# Altium footprint library UP-ROBOT Devices(2013-02-26).PcbLib: 150 footprints (part 9 of 10)
Each footprint in its own frame and in the unit in brackets; x right, y up, seen from the top. Pads: shape width x height; smd on the part's side, far side on the other; paste and mask are expansions set on the pad; w line width, h text height; cw(c..) or ccw(c..) is an arc to the next point about the centre after c.
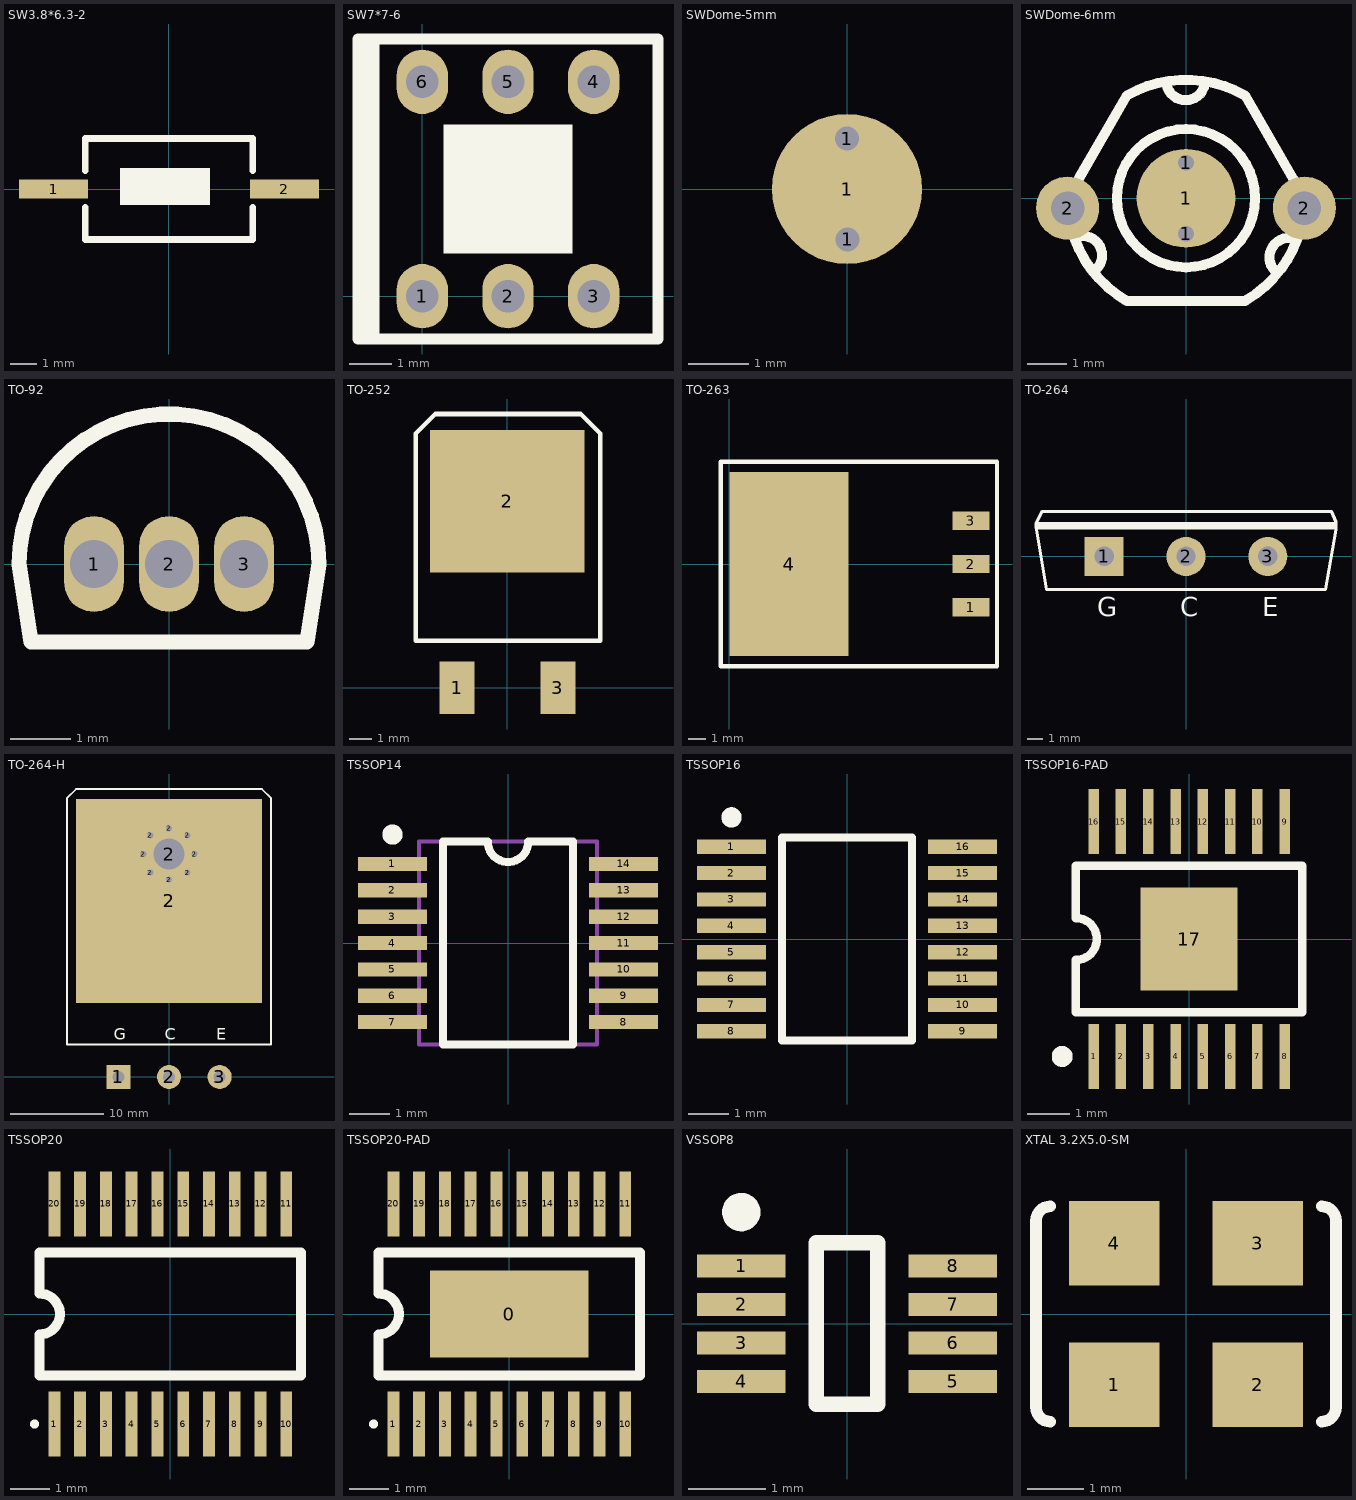
[diagram p8: the footprints below, top view; thin cyan lines are the x and y axes]

## SW3.8*6.3-2 [mm]
height 2.56
pads (2):
  rect 2.6x0.7 smd: 1(-4.35,0) 2(4.35,0)
Top Overlay:
  rectangle: -1.85,-0.6 1.55,0.8
  lines w0.254: -3.15,-0.7 -3.15,-1.9 3.15,-1.9 3.15,-0.7 ; -3.15,0.7 -3.15,1.9 3.15,1.9 3.15,0.7

## SW7*7-6 [mm]
pads (6):
  oval 1.2x1.5 hole 0.76: 1(0,0) 2(2,0) 3(4,0) 4(4,5) 5(2,5) 6(0,5)
Top Overlay:
  rectangle: 0.5,1 3.5,4
  rectangle: -1.5,-1 -1,6
  lines w0.254: -1.5,-1 5.5,-1 5.5,6 -1.5,6 -1.5,-1

## SWDome-5mm [mm]
pads (3):
  round 2.5 smd: 1(0,0)
  round 0.8 hole 0.4: 1(0,0.84) 1(0.01,-0.84)
Top Solder:
  circle w1: c0,0 r2.5
3D body: height 0.66, standoff 0, extent -3.1,-3.1 3.1,3.1

## SWDome-6mm [mm]
pads (5):
  round 0.7 hole 0.4: 1(0,-0.9) 1(0,0.9)
  round 2.5 smd: 1(0,0)
  round 1.6 hole 0.85: 2(-3,-0.25) 2(3,-0.25)
Top Overlay:
  circle w0.254: c0,0 r1.75
  lines w0.254: -2.821,-1.026 ccw(c0,0) -1.511,-2.594 ; -2.816,-1 cw(c-2.617,-1.45) -2.352,-1.864 ; -2.709,0.505 -1.5,2.6 cw(c0,0) 1.495,2.603 ; -1.5,-2.6 1.5,-2.6 ; -0.499,2.95 ccw(c-0.008,2.975) 0.484,2.95 ; 1.5,2.6 2.719,0.486 ; 1.519,-2.589 ccw(c0,0) 2.821,-1.026 ; 2.316,-1.897 cw(c2.608,-1.5) 2.801,-1.047

## TO-92 [mm]
pads (3):
  oval 1x1.6 hole 0.8: 1(-1.25,0) 2(0,0) 3(1.25,0)
Top Overlay:
  lines w0.254: -2.5,0 cw(c0,0) 2.5,0 2.3,-1.3 -2.3,-1.3 -2.5,0
3D body: height 4, standoff -3, extent -2.3,-1.2 2.28,2.34

## TO-252 [mm] "DPAK"
pads (3):
  rect 1.524x2.28 smd: 1(-2.2,0) 3(2.2,0)
  rect 6.74x6.23 smd: 2(0,8.14)
Top Overlay:
  lines w0.203: -4,2.05 -4,11.1 -3.15,11.95 3.2,11.95 4.05,11.1 4.05,2.05 -4,2.05
3D body: height 2.2, standoff 0, extent -3.24,-0.5 3.26,10.5

## TO-263 [mm]
pads (4):
  rect 2.16x1.07 smd: 1(14.17,-2.54) 2(14.17,0) 3(14.17,2.54)
  rect 7x10.8 smd: 4(3.5,0)
Top Overlay:
  lines w0.254: -0.5,-6 15.7,-6 15.7,6 -0.5,6 -0.5,-6

## TO-264 [mm]
pads (3):
  rect 2.6x2.6 hole 1.3: 1(-5.45,0)
  round 2.6 hole 1.3: 2(0,0) 3(5.45,0)
Top Overlay:
  rectangle: -10,1.8 10,2.3
  lines w0.203: -10,1.9 -10,2.2 -9.6,3 9.7,3 10,2.3 10,1.8 9.3,-2.2 -9.3,-2.2 -10,2
  text "G" at -5.9,-4 h1.27
  text "C" at -0.4,-4 h1.27
  text "E" at 5.1,-4 h1.27

## TO-264-H [mm]
pads (13):
  rect 2.6x2.6 hole 1.3: 1(-5.45,0)
  round 1.016 hole 0.66: 2(-2.75,24) 2(-2,22) 2(-2,26) 2(0,21.25) 2(0,26.75) 2(2,22) 2(2,26) 2(2.75,24)
  round 2.6 hole 1.3: 2(0,0) 3(5.45,0)
  rect 20x22 smd: 2(0,18.95)
  round 7 hole 3.3: 2(0,24)
Top Overlay:
  lines w0.2: -11,3.5 -11,30 -10,31 10,31 11,30 11,3.5 -11,3.5
  text "E" at 5.1,4 h1.27
  text "C" at -0.45,4 h1.27
  text "G" at -5.95,4 h1.27
3D body: height 5, standoff -3, extent -10,-0.279 10,30.021

## TSSOP14 [mm] "TSOP, 14-Leads, Body 5.0x4.4mm (max), Pitch 0.65mm, IPC Medium Density"
height 1.1
pads (14):
  rect 1.7x0.35 smd: 1(-2.85,1.95) 2(-2.85,1.3) 3(-2.85,0.65) 4(-2.85,0) 5(-2.85,-0.65) 6(-2.85,-1.3) 7(-2.85,-1.95) 8(2.85,-1.95) 9(2.85,-1.3) 10(2.85,-0.65) 11(2.85,0) 12(2.85,0.65) 13(2.85,1.3) 14(2.85,1.95)
Top Overlay:
  circle w0.25: c-2.85,2.675 r0.125
  lines w0.2: -1.6,-2.5 1.6,-2.5 1.6,2.5 0.5,2.5 cw(c0,2.498) -0.5,2.5 -1.6,2.5 -1.6,-2.5
Mechanical 13:
  lines w0.1: -2.2,-2.5 2.2,-2.5 2.2,2.5 -2.2,2.5 -2.2,-2.5
3D body: height 1.1, standoff 0.2, extent -2.2,-2.5 2.2,2.5

## TSSOP16 [mm]
height 1.2
pads (16):
  rect 1.7x0.35 smd: 1(-2.85,2.275) 2(-2.85,1.625) 3(-2.85,0.975) 4(-2.85,0.325) 5(-2.85,-0.325) 6(-2.85,-0.975) 7(-2.85,-1.625) 8(-2.85,-2.275) 9(2.85,-2.275) 10(2.85,-1.625) 11(2.85,-0.975) 12(2.85,-0.325) 13(2.85,0.325) 14(2.85,0.975) 15(2.85,1.625) 16(2.85,2.275)
Top Overlay:
  circle w0.25: c-2.85,3 r0.125
  lines w0.2: -1.6,-2.5 1.6,-2.5 1.6,2.5 -1.6,2.5 -1.6,-2.5
3D body: height 1.1, standoff 0, extent -3.192,-2.499 3.208,2.501

## TSSOP16-PAD [mm]
pads (17):
  rect 0.25x1.55 smd: 1(-2.275,-2.8) 2(-1.625,-2.8) 3(-0.975,-2.8) 4(-0.325,-2.8) 5(0.325,-2.8) 6(0.975,-2.8) 7(1.625,-2.8) 8(2.275,-2.8) 9(2.275,2.8) 10(1.625,2.8) 11(0.975,2.8) 12(0.325,2.8) 13(-0.325,2.8) 14(-0.975,2.8) 15(-1.625,2.8) 16(-2.275,2.8)
  rect 2.31x2.46 smd: 17(0,0)
Top Overlay:
  circle w0.25: c-3.025,-2.8 r0.125
  lines w0.203: -2.7,-1.75 2.7,-1.75 2.7,1.75 0,1.75 -2.7,1.75 -2.7,0.5 cw(c-2.7,0) -2.7,-0.5 -2.7,-1.75
3D body: height 1.2, standoff 0, extent -2.56,-3.3 2.54,3.3

## TSSOP20 [mm]
pads (20):
  rect 0.3x1.65 smd: 1(-2.925,-2.775) 2(-2.275,-2.775) 3(-1.625,-2.775) 4(-0.975,-2.775) 5(-0.325,-2.775) 6(0.325,-2.775) 7(0.975,-2.775) 8(1.625,-2.775) 9(2.275,-2.775) 10(2.925,-2.775) 11(2.925,2.775) 12(2.275,2.775) 13(1.625,2.775) 14(0.975,2.775) 15(0.325,2.775) 16(-0.325,2.775) 17(-0.975,2.775) 18(-1.625,2.775) 19(-2.275,2.775) 20(-2.925,2.775)
Top Overlay:
  circle w0.203: c-3.425,-2.775 r0.01
  lines w0.25: -3.3,-1.55 3.3,-1.55 3.3,1.55 -3.3,1.55 -3.3,0.517 cw(c-3.3,0) -3.3,-0.517 -3.3,-1.55
3D body: height 1.08, standoff -0.02, extent -3.25,-3.225 3.25,3.175

## TSSOP20-PAD [mm]
pads (21):
  rect 4x2.2 smd: 0(0,0)
  rect 0.3x1.65 smd: 1(-2.925,-2.775) 2(-2.275,-2.775) 3(-1.625,-2.775) 4(-0.975,-2.775) 5(-0.325,-2.775) 6(0.325,-2.775) 7(0.975,-2.775) 8(1.625,-2.775) 9(2.275,-2.775) 10(2.925,-2.775) 11(2.925,2.775) 12(2.275,2.775) 13(1.625,2.775) 14(0.975,2.775) 15(0.325,2.775) 16(-0.325,2.775) 17(-0.975,2.775) 18(-1.625,2.775) 19(-2.275,2.775) 20(-2.925,2.775)
Top Overlay:
  circle w0.203: c-3.425,-2.775 r0.01
  lines w0.25: -3.3,-1.55 3.3,-1.55 3.3,1.55 -3.3,1.55 -3.3,0.517 cw(c-3.3,0) -3.3,-0.517 -3.3,-1.55
3D body: height 1.08, standoff -0.02, extent -3.25,-3.225 3.25,3.175

## VSSOP8 [mm]
pads (8):
  rect 1.15x0.3 smd: 1(-1.375,0.75) 2(-1.375,0.25) 3(-1.375,-0.25) 4(-1.375,-0.75) 5(1.375,-0.75) 6(1.375,-0.25) 7(1.375,0.25) 8(1.375,0.75)
Top Overlay:
  circle w0.25: c-1.375,1.45 r0.125
  lines w0.2: -0.4,-1.05 -0.4,1.05 0.4,1.05 0.4,-1.05 -0.4,-1.05
3D body: height 1, standoff 0, extent -1.4,-1.15 1.4,1.15

## XTAL 3.2X5.0-SM [mm]
pads (4):
  rect 1.6x1.5 smd: 1(-1.27,-1.25) 2(1.27,-1.25) 3(1.27,1.25) 4(-1.27,1.25)
Top Overlay:
  lines w0.203: -2.4,-1.9 cw(c-2.4,-1.65) -2.65,-1.65 -2.65,-1.25 -2.65,0 -2.65,1.5 -2.65,1.65 cw(c-2.4,1.65) -2.4,1.9 ; 2.4,-1.9 ccw(c2.4,-1.65) 2.65,-1.65 2.65,-1.5 2.65,0 2.65,1.25 2.65,1.65 ccw(c2.4,1.65) 2.4,1.9